# Altium footprint library PCB1.PcbLib: 47 footprints (part 3 of 3)
Each footprint in its own frame and in the unit in brackets; x right, y up, seen from the top. Pads: shape width x height; smd on the part's side, far side on the other; paste and mask are expansions set on the pad; w line width, h text height; cw(c..) or ccw(c..) is an arc to the next point about the centre after c.
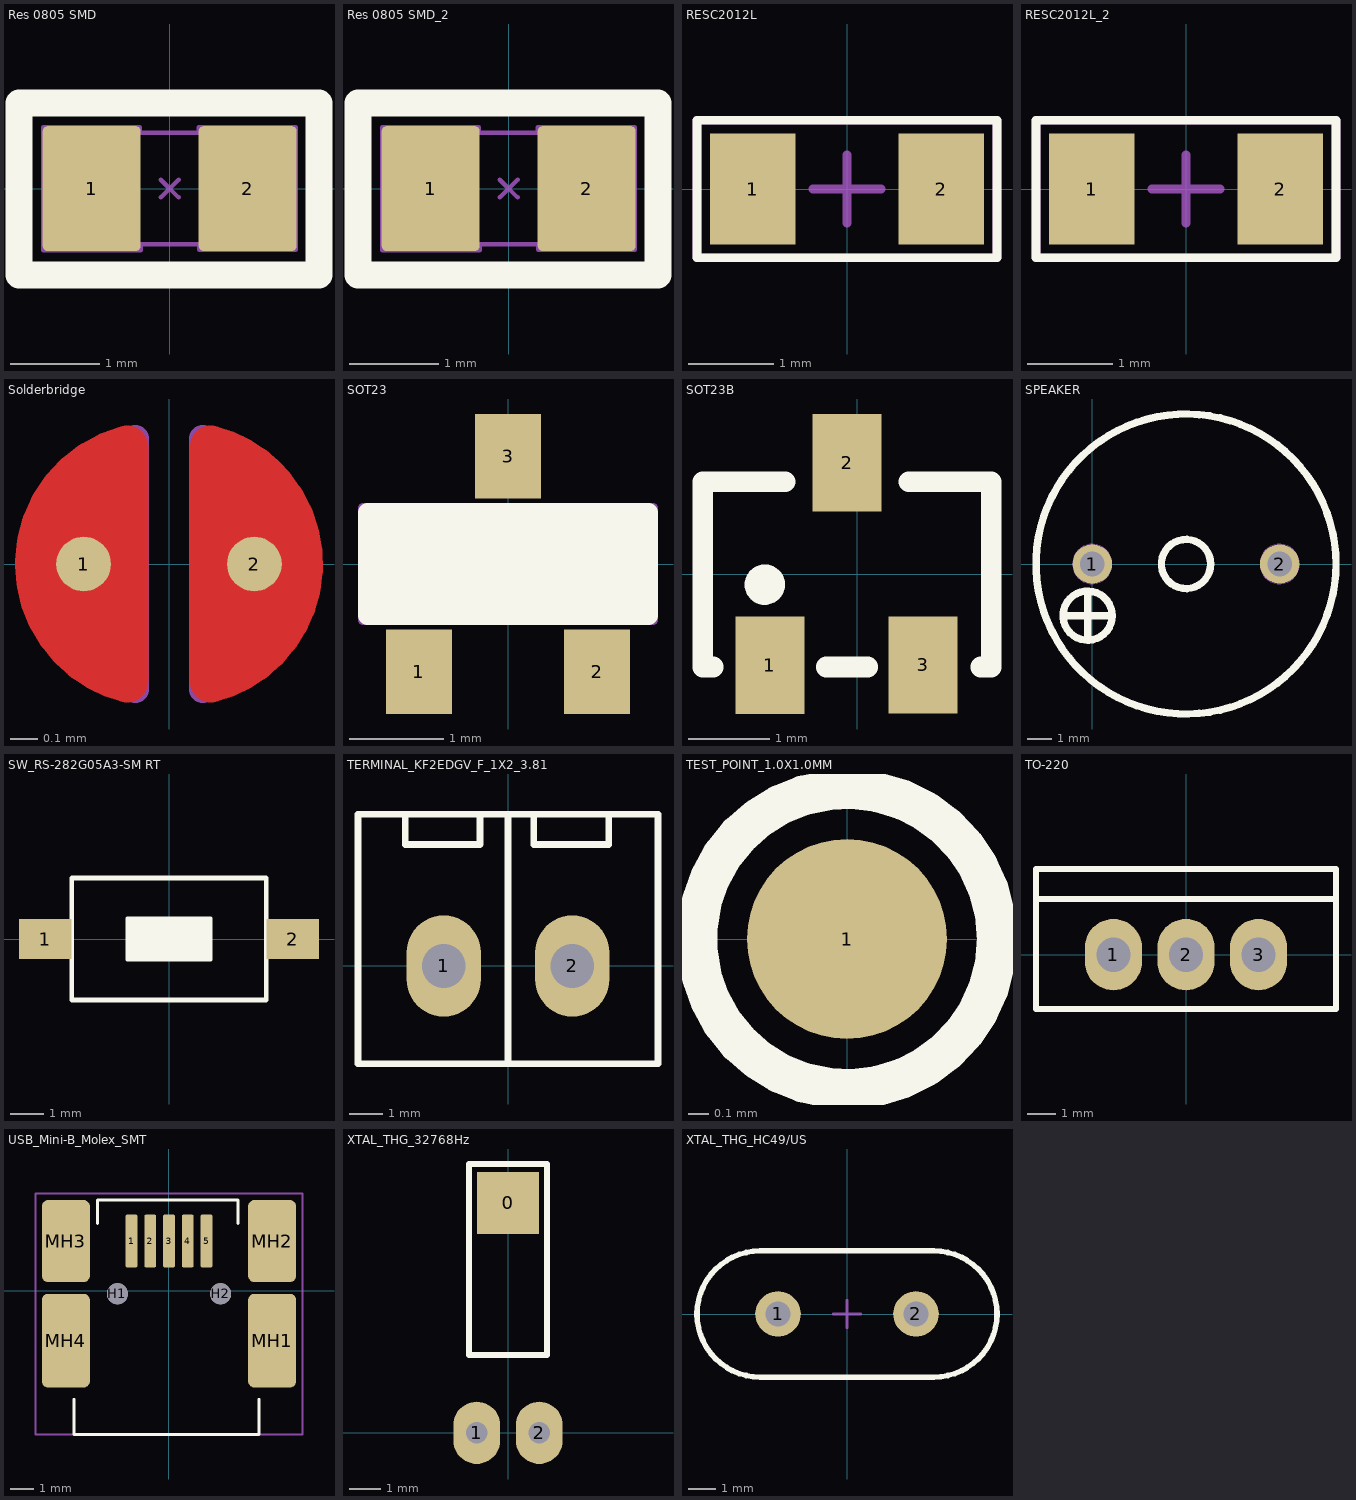
[diagram p2: the footprints below, top view; thin cyan lines are the x and y axes]

## Res 0805 SMD [mm]
pads (2):
  rrect10% 1.1x1.4 smd mask+0.1: 1(-0.875,0) 2(0.875,0)
Top Overlay:
  lines w0.3: -1.69,-0.97 -1.69,0.96 1.675,0.96 1.675,-0.97 -1.69,-0.97
Top Courtyard:
  lines w0.05: -0.331,0.642 -0.334,0.642 -0.334,0.687 -1.416,0.687 -1.416,-0.69 -1.413,-0.69 -0.327,-0.69 ; -0.325,-0.69 -0.325,-0.632 ; 0.324,0.632 0.324,0.69 ; 0.327,0.69 1.413,0.69 ; 0.334,-0.642 0.334,-0.687 1.416,-0.687 1.416,0.69 ; -1,-0.625 -1,0.625 1,0.625 1,-0.625 -1,-0.625
Mechanical 15:
  lines w0.05: -0.1,-0.1 0.1,0.1 ; -0.1,0.1 0.1,-0.1 ; -1,-0.625 -1,0.625 1,0.625 1,-0.625 -1,-0.625
3D body "User Library-SMD RESISTOR-10805.STEP": height 0.62, standoff 0.02, extent -1,-0.625 1,0.625

## Res 0805 SMD_2 [mm]
pads (2):
  rrect10% 1.1x1.4 smd mask+0.1: 1(-0.875,0) 2(0.875,0)
Top Overlay:
  lines w0.3: -1.69,-0.97 1.675,-0.97 1.675,0.96 -1.69,0.96 -1.69,-0.97
Top Courtyard:
  lines w0.05: -0.331,0.642 -0.334,0.642 -0.334,0.687 -1.416,0.687 -1.416,-0.69 -1.413,-0.69 -0.327,-0.69 ; -0.325,-0.69 -0.325,-0.632 ; 0.324,0.632 0.324,0.69 ; 0.327,0.69 1.413,0.69 ; 0.334,-0.642 0.334,-0.687 1.416,-0.687 1.416,0.69 ; -1,-0.625 -1,0.625 1,0.625 1,-0.625 -1,-0.625
Mechanical 15:
  lines w0.05: -0.1,-0.1 0.1,0.1 ; -0.1,0.1 0.1,-0.1 ; -1,-0.625 1,-0.625 1,0.625 -1,0.625 -1,-0.625
3D body "User Library-SMD RESISTOR-10805.STEP": height 0.62, standoff 0.02, extent -1,-0.625 1,0.625

## RESC2012L [mm]
pads (2):
  rect 1x1.3 smd: 1(-1.1,0) 2(1.1,0)
Top Overlay:
  lines w0.1: -1.75,-0.8 1.75,-0.8 1.75,0.8 -1.75,0.8 -1.75,-0.8
Mechanical 13:
  lines w0.1: -1.75,-0.8 -1.75,0.8 1.75,0.8 1.75,-0.8 -1.75,-0.8
Mechanical 15:
  lines w0.1: -0.4,0 0.4,0 ; 0,-0.4 0,0.4
3D body "User Library-RESC2012X05N.STEP": height 0.45, standoff 0, extent -0.995,-0.625 1.005,0.625

## RESC2012L_2 [mm]
pads (2):
  rect 1x1.3 smd: 1(-1.1,0) 2(1.1,0)
Top Overlay:
  lines w0.1: -1.75,-0.8 1.75,-0.8 1.75,0.8 -1.75,0.8 -1.75,-0.8
Mechanical 13:
  lines w0.1: -1.75,-0.8 1.75,-0.8 1.75,0.8 -1.75,0.8 -1.75,-0.8
Mechanical 15:
  lines w0.1: -0.4,0 0.4,0 ; 0,-0.4 0,0.4
3D body "User Library-RESC2012X05N.STEP": height 0.45, standoff 0, extent -0.995,-0.625 1.005,0.625

## Solderbridge [mm]
pads (2):
  round 0.2 smd paste-10: 1(-0.312,0) 2(0.312,0)
Top Layer:
  region: 0.077,0.432 0.152,0.505 0.271,0.467 0.335,0.424 0.409,0.351 0.462,0.292 0.521,0.193 0.549,0.099 0.544,-0.122 0.518,-0.193 0.434,-0.33 0.351,-0.411 0.259,-0.469 0.157,-0.5 0.107,-0.483 0.077,-0.43
  region: -0.077,-0.432 -0.152,-0.505 -0.271,-0.467 -0.335,-0.424 -0.409,-0.351 -0.462,-0.292 -0.521,-0.193 -0.549,-0.099 -0.544,0.122 -0.518,0.193 -0.434,0.33 -0.351,0.411 -0.259,0.469 -0.157,0.5 -0.107,0.483 -0.077,0.43
  lines w0.152: -0.153,-0.431 cw(c-0.042,0) -0.312,-0.353 cw(c-0.042,0) -0.487,0 cw(c-0.042,0) -0.487,0.006 cw(c-0.042,0) -0.153,0.431 ; 0.153,-0.431 ccw(c0.042,0) 0.312,-0.353 ccw(c0.042,0) 0.478,-0.088 ccw(c0.042,0) 0.383,0.286 ccw(c0.042,0) 0.312,0.353 ccw(c0.042,0) 0.153,0.431
Top Solder:
  circle w0.61: c-0.003,0 r0.279
Bottom Courtyard:
  lines w0.1: -0.123,-0.459 cw(c-0.042,0) -0.123,0.459 -0.123,-0.459 ; 0.123,-0.459 ccw(c0.042,0) 0.123,0.459 0.123,-0.459
  text ".Designator" at -0.635,0.635 h0.38

## SOT23 [mm]
pads (3):
  rect 0.7x0.9 smd: 1(-0.95,-1.15) 2(0.95,-1.15) 3(0,1.15)
Top Overlay:
  region: -1.5,-0.55 1.5,-0.55 1.5,0.55 -1.5,0.55
  lines w0.2: -1.5,-0.55 -1.5,0.55 1.5,0.55 1.5,-0.55 -1.5,-0.55
Mechanical 13:
  lines w0.1: -1.55,-0.6 1.55,-0.6 1.55,0.6 -1.55,0.6 -1.55,-0.6
Mechanical 15:
  lines w0.1: -0.5,0 0.5,0 ; 0,-0.5 0,0.5
3D body "SW3DPS-SOT-23-DEFAULT.STEP": height 1.06, standoff -0.04, extent -1.5,-1.28 1.5,1.22

## SOT23B [mm]
pads (3):
  rect 0.85x1.2 smd: 1(-1.077,-1.123) 2(-0.127,1.377) 3(0.813,-1.118)
Top Overlay:
  circle w0.25: c-1.141,-0.127 r0.125
  lines w0.254: -1.778,-1.143 -1.905,-1.143 -1.905,1.143 -0.889,1.143 ; -0.381,-1.143 0.127,-1.143 ; 0.635,1.143 1.651,1.143 1.651,-1.143 1.524,-1.143
3D body "SW3DPS-SOT-23-DEFAULT.STEP": height 1.06, standoff -0.04, extent -1.627,-1.174 1.373,1.326

## SPEAKER [mm]
pads (2):
  round 1.6 hole 1 mask+0.1: 1(0,0) 2(7.62,0)
Top Overlay:
  circle w0.3: c3.81,0 r1
  circle w0.3: c-0.19,-2.1 r1
  circle w0.3: c3.81,0 r6.1
  lines w0.3: -1.19,-2.1 0.81,-2.1 ; -0.19,-3.1 -0.19,-1.1
Mechanical 2:
  circle w0.05: c0,0 r0.8
  circle w0.05: c3.81,0 r1
  circle w0.05: c7.62,0 r0.8
  circle w0.05: c-0.19,-2.1 r1
  circle w0.05: c3.81,0 r6.1
  lines w0.05: -1.19,-2.1 0.81,-2.1 ; -0.19,-3.1 -0.19,-1.1
  text "1" at -0.2,-0.5 h1.2
  text "2" at 7.32,-0.6 h1.2
3D body "User Library-Buzzer14mm.step": height 7.35, standoff -3.1, extent -3,-7 11,7

## SW_RS-282G05A3-SM RT [mm]
pads (2):
  rect 1.6x1.2 smd: 1(-3.75,0) 2(3.75,0)
Top Overlay:
  rectangle: -1.27,-0.635 1.27,0.635
  lines w0.1: -1.27,-0.635 -1.27,0.635 1.27,0.635 1.27,-0.635 -1.27,-0.635
  lines w0.15: -2.95,-1.854 -2.95,1.854 2.95,1.854 2.95,-1.854 -2.95,-1.854
Mechanical 13:
  lines w0.1: -2.95,-1.85 -2.95,1.85 2.95,1.85 2.95,-1.85 -2.95,-1.85
Mechanical 15:
  lines w0.1: -0.5,0 0.5,0 ; 0,-0.5 0,0.5
3D body "Tactile Switch_RS-282G05A3-SM RT.stp": height 2.5, standoff -0.02, extent -4,-1.8 4,1.8

## TERMINAL_KF2EDGV_F_1X2_3.81 [mm]
pads (2):
  oval 2.2x3 hole 1.3: 1(-1.905,0) 2(1.905,0)
Top Overlay:
  lines w0.2: -3.048,4.5 -3.048,3.6 -1.938,3.6 ; -1.928,3.6 -0.828,3.6 -0.828,4.5 ; 0,-2.8 0,4.5 ; 0.762,4.5 0.762,3.6 1.872,3.6 ; 1.882,3.6 2.982,3.6 2.982,4.5 ; -4.445,-2.9 4.445,-2.9 4.445,4.5 -4.445,4.5 -4.445,-2.9
3D body "691321300002 (rev1).stp": height 9.25, standoff -3.45, extent -4.405,-2.78 4.405,4.42

## TEST_POINT_1.0X1.0MM [mm]
pads (1):
  round 1 smd: 1(0,0)
Top Overlay:
  circle w0.2: c0,0 r0.75

## TO-220 [mm]
pads (3):
  oval 2x2.5 hole 1.2: 1(-2.54,0) 2(0,0) 3(2.54,0)
Top Overlay:
  lines w0.2: -5.25,1.95 5.25,1.95 ; -5.25,-1.905 -5.25,1.7 -5.25,3 5.25,3 5.25,1.7 5.25,-1.905 -5.25,-1.905
3D body "User Library-TO-220-3.step": height 8.08, standoff -20.7, extent -4.96,-2.134 4.941,2.366

## USB_Mini-B_Molex_SMT [mm]
pads (11):
  rrect25% 0.5x2.25 smd: 1(-1.6,2.125) 2(-0.8,2.125) 3(0,2.125) 4(0.8,2.125) 5(1.6,2.125)
  round 0.9 hole 0.9 unplated: H1(-2.2,-0.125) H2(2.2,-0.125)
  rrect25% 2.05x4 smd: MH1(4.4,-2.125) MH4(-4.4,-2.125)
  rrect25% 2.05x3.5 smd: MH2(4.4,2.125) MH3(-4.4,2.125)
Top Overlay:
  lines w0.127: -4.05,-4.625 -4.05,-6.125 3.85,-6.125 3.85,-4.625 ; -3.05,2.875 -3.05,3.875 2.95,3.875 2.95,2.875
Mechanical 15:
  lines w0.076: -5.7,-6.125 -5.7,4.15 5.7,4.15 5.7,-6.125 -5.7,-6.125
3D body "usb_mini_smd.STEP": height 4.15, standoff -0.94, extent -4.953,-5.998 4.947,3.202

## XTAL_THG_32768Hz [mm]
pads (3):
  rect 2x2 smd: 0(0,7.375)
  oval 1.5x2 hole 0.7: 1(-1,0) 2(1,0)
Top Overlay:
  lines w0.2: -1.25,2.5 1.25,2.5 1.25,8.625 -1.25,8.625 -1.25,2.5
3D body "User Library-DT-26-1.step": height 2.1, standoff -1.9, extent -1,-0.125 1,7.015

## XTAL_THG_HC49/US [mm]
pads (2):
  round 1.65 hole 0.9: 1(-2.5,0.001) 2(2.5,0.001)
Top Overlay:
  lines w0.2: -3.15,-2.286 cw(c-3.15,0) -3.15,2.286 3.15,2.286 cw(c3.15,0) 3.15,-2.286 -3.15,-2.286
Mechanical 15:
  lines w0.1: -0.5,0 0.5,0 ; 0,-0.5 0,0.5
3D body "ABL.STEP": height 3.25, standoff -5.75, extent -5.75,-2.5 5.75,2.5